# Altium footprint library IC.Pcblib: 91 footprints (part 2 of 6)
Each footprint in its own frame and in the unit in brackets; x right, y up, seen from the top. Pads: shape width x height; smd on the part's side, far side on the other; paste and mask are expansions set on the pad; w line width, h text height; cw(c..) or ccw(c..) is an arc to the next point about the centre after c.
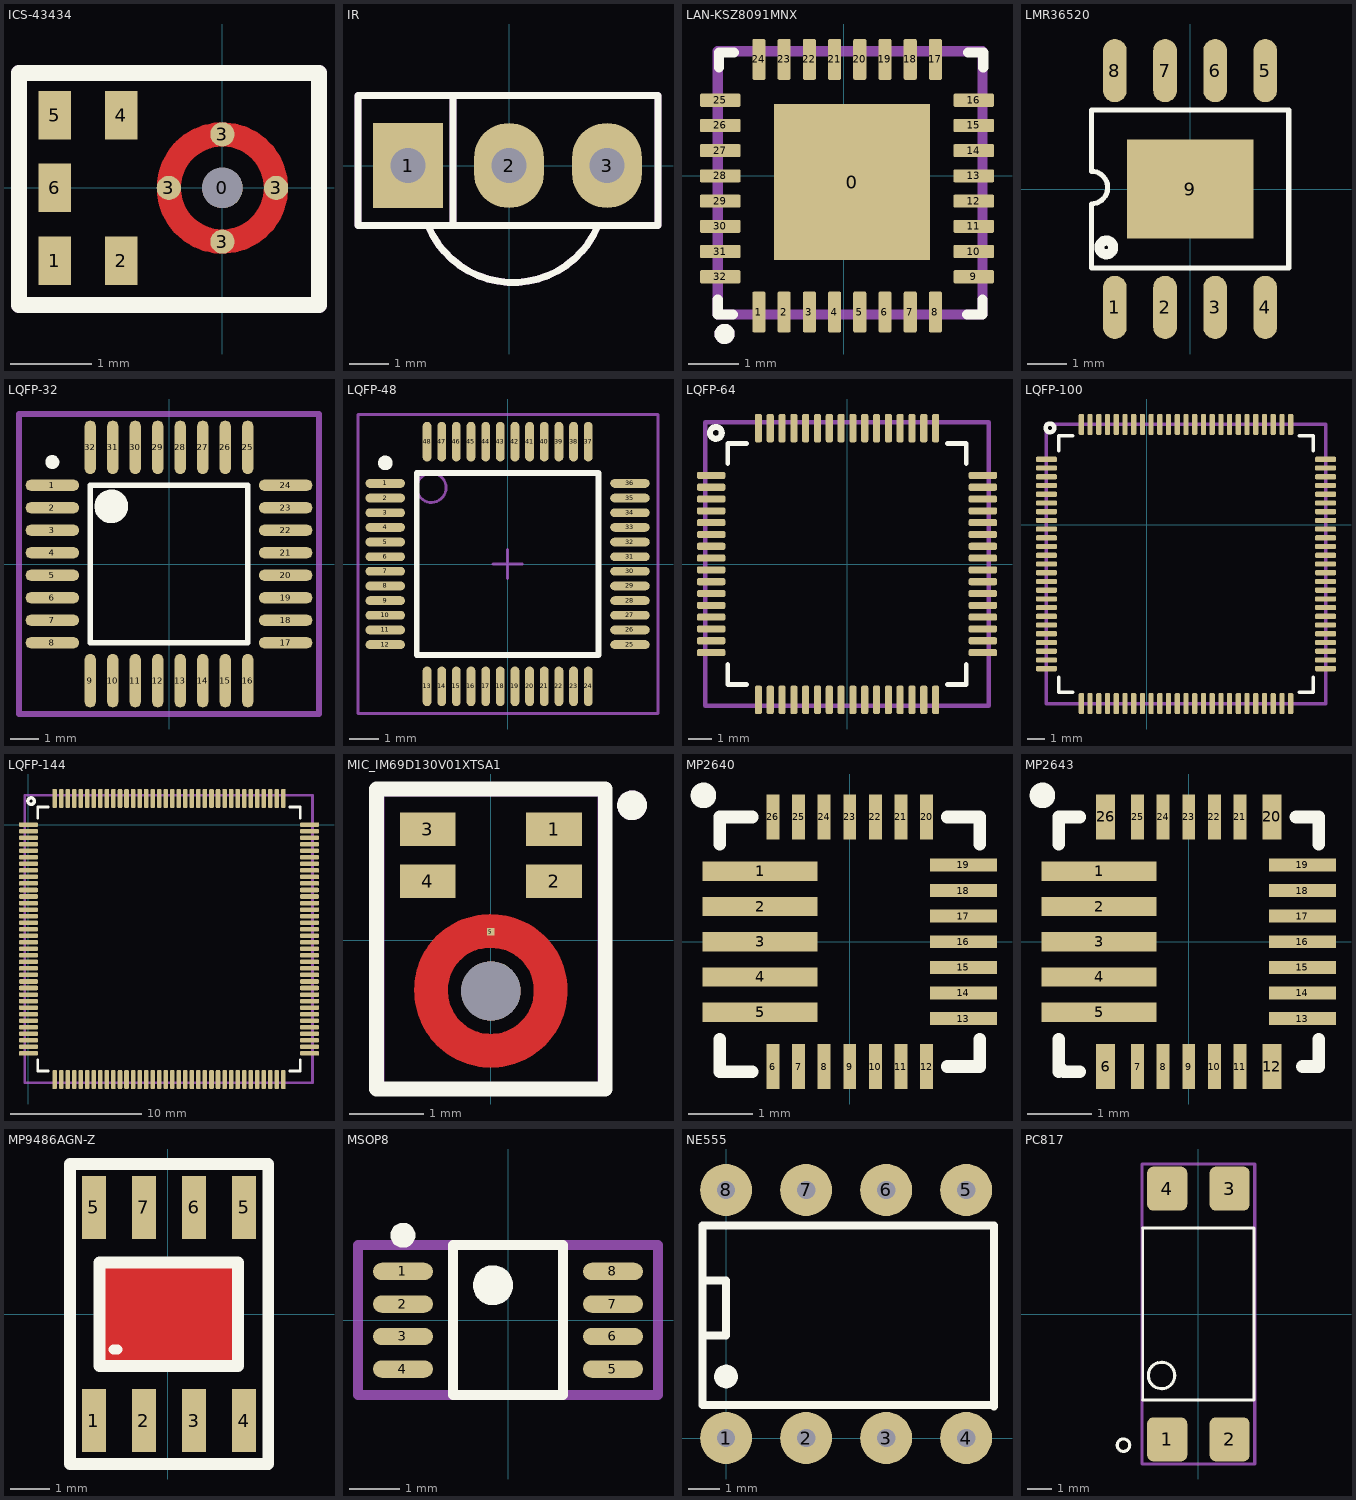
[diagram p1: the footprints below, top view; thin cyan lines are the x and y axes]

## ICS-43434 [mm] "INVENSENSE MEMS DIGITAL MICROPHONE"
pads (10):
  round 0.5 hole 0.5 unplated paste-5 mask+0.775: 0(0,0)
  rect 0.4x0.6 smd: 1(-2.074,-0.9) 2(-1.252,-0.9) 4(-1.252,0.9) 5(-2.074,0.9) 6(-2.074,0)
  round 0.3 smd: 3(-0.663,0) 3(0,-0.663) 3(0.663,0)
  round 0.3 smd paste+0: 3(0,0.663)
Top Layer:
  circle w0.3: c0,0 r0.663
Top Overlay:
  lines w0.2: -2.515,-1.448 -2.515,1.422 1.194,1.422 1.194,-1.448 -2.515,-1.448
Mechanical 13:
  lines w0.2: -2.515,-1.448 -2.515,1.422 1.194,1.422 1.194,-1.448 -2.515,-1.448
  text ".Designator" at -2.616,-0.562 h2
3D body: height 1, standoff 0, extent -2.45,-1.325 1.04,1.325

## IR [mil]
pads (3):
  rect 70x85 hole 35: 1(-101,0)
  oval 70x85 hole 35: 2(0,0) 3(98,0)
Top Overlay:
  lines w7: -81,-60 ccw(c4,-25) 89,-60 ; -56,-60 -56,70 ; -151,-60 149,-60 149,70 -151,70 -151,-60
Mechanical 13:
  lines w7: -81,-60 ccw(c4,-25) 89,-60 ; -56,-60 -56,70 ; -151,-60 -151,70 149,70 149,-60 -151,-60
Mechanical 15:
  lines w7: -81,-60 ccw(c4,-25) 89,-60 ; -56,-60 -56,70 ; -151,-60 -151,70 149,70 149,-60 -151,-60
3D body "SW3dPS-TO92.STEP": height 245.04, standoff -199.79, extent -108.87,-99.53 108.87,61.03

## LAN-KSZ8091MNX [mm]
pads (33):
  rect 3.1x3.1 smd paste-2539.97 mask+0.102: 0(0.163,-0.126)
  rrect25% 0.26x0.81 smd: 1(-1.683,-2.704) 2(-1.183,-2.704) 3(-0.683,-2.704) 4(-0.183,-2.704) 5(0.317,-2.704) 6(0.817,-2.704) 7(1.317,-2.704) 8(1.817,-2.704) 17(1.817,2.306) 18(1.317,2.306) 19(0.817,2.306) 20(0.317,2.306) 21(-0.183,2.306) 22(-0.683,2.306) 23(-1.183,2.306) 24(-1.683,2.306)
  rrect25% 0.81x0.26 smd: 9(2.577,-2.004) 10(2.577,-1.504) 11(2.577,-1.004) 12(2.577,-0.504) 13(2.577,-0.004) 14(2.577,0.496) 15(2.577,0.996) 16(2.577,1.496) 25(-2.45,1.496) 26(-2.45,0.996) 27(-2.45,0.496) 28(-2.45,-0.004) 29(-2.45,-0.504) 30(-2.45,-1.004) 31(-2.45,-1.504) 32(-2.45,-2.004)
Top Overlay:
  circle w0.2: c-2.365,-3.139 r0.1
  lines w0.2: -2.5,-2.454 -2.5,-2.754 -2.2,-2.754 ; -2.475,2.146 -2.475,2.446 -2.175,2.446 ; 2.447,-2.754 2.747,-2.754 2.747,-2.454 ; 2.465,2.446 2.765,2.446 2.765,2.146
Top Paste:
  region: -1.02,1.016 -1.02,0 -0.004,0 -0.004,1.016
  region: 1.266,1.016 0.25,1.016 0.25,0 1.266,0
  region: 1.266,-1.27 1.266,-0.254 0.25,-0.254 0.25,-1.27
  region: -1.02,-1.27 -0.004,-1.27 -0.004,-0.254 -1.02,-0.254
Mechanical 13:
  circle w0.2: c-2.365,-3.139 r0.1
  lines w0.2: -2.5,-2.754 -2.5,2.468 2.747,2.468 2.747,-2.754 -2.5,-2.754
  text ".Designator" at -0.2,-3.129 h1
Mechanical 15:
  text ".Comment" at -0.488,-2.742 h1
3D body "QFN-24 (4x4x0.9).step": height 0.92, standoff 0, extent -1.825,-2.114 2.175,1.886

## LMR36520 [mm]
pads (9):
  oval 0.6x1.6 smd paste+0 mask+0.051: 1(-1.905,-3) 2(-0.635,-3) 3(0.635,-3) 4(1.905,-3) 5(1.905,3) 6(0.635,3) 7(-0.635,3) 8(-1.905,3)
  rect 3.2x2.5 smd paste+0 mask+0.051: 9(0,0)
Top Overlay:
  circle w0.254: c-2.123,-1.479 r0.175
  lines w0.129: -2.5,0.45 cw(c-2.5,0.037) -2.499,-0.376 ; -2.5,-0.375 -2.5,-2 2.5,-2 2.5,2 -2.5,2 -2.5,0.45
Mechanical 15:
  circle w0.2: c-1.898,-3.235 r0.1
3D body "SOIC-81.step": height 1.44, standoff 0, extent -2.5,-3.015 2.5,3.015

## LQFP-32 [mm]
pads (32):
  oval 1.9x0.4 smd: 1(-4.15,2.8) 2(-4.15,2) 3(-4.15,1.2) 4(-4.15,0.4) 5(-4.15,-0.4) 6(-4.15,-1.2) 7(-4.15,-2) 8(-4.15,-2.8) 17(4.15,-2.8) 18(4.15,-2) 19(4.15,-1.2) 20(4.15,-0.4) 21(4.15,0.4) 22(4.15,1.2) 23(4.15,2) 24(4.15,2.8)
  oval 0.4x1.9 smd: 9(-2.8,-4.15) 10(-2,-4.15) 11(-1.2,-4.15) 12(-0.4,-4.15) 13(0.4,-4.15) 14(1.2,-4.15) 15(2,-4.15) 16(2.8,-4.15) 25(2.8,4.15) 26(2,4.15) 27(1.2,4.15) 28(0.4,4.15) 29(-0.4,4.15) 30(-1.2,4.15) 31(-2,4.15) 32(-2.8,4.15)
Top Overlay:
  circle w0.6: c-2.05,2.05 r0.3
  circle w0.25: c-4.15,3.625 r0.125
  lines w0.2: -2.8,-2.8 2.8,-2.8 2.8,2.8 -2.8,2.8 -2.8,-2.8
Mechanical 13:
  lines w0.2: -5.334,-5.334 5.334,-5.334 5.334,5.334 -5.334,5.334 -5.334,-5.334
  text ".Designator" at -2.1,-0.2 h1
Mechanical 15:
  lines w0.2: -5.334,-5.334 5.334,-5.334 5.334,5.334 -5.334,5.334 -5.334,-5.334
  text ".Comment" at -2.1,-0.2 h1
3D body "User Library-TQFP-32.STEP": height 1.4, standoff -0.06, extent -4.5,-4.5 4.5,4.5

## LQFP-48 [mm] "TSQFP, 48-Leads, Body 7.00x7.00mm, Pitch 0.50mm, IPC Medium Density"
height 1.6
pads (48):
  oval 1.35x0.3 smd: 1(-4.175,2.75) 2(-4.175,2.25) 3(-4.175,1.75) 4(-4.175,1.25) 5(-4.175,0.75) 6(-4.175,0.25) 7(-4.175,-0.25) 8(-4.175,-0.75) 9(-4.175,-1.25) 10(-4.175,-1.75) 11(-4.175,-2.25) 12(-4.175,-2.75) 25(4.175,-2.75) 26(4.175,-2.25) 27(4.175,-1.75) 28(4.175,-1.25) 29(4.175,-0.75) 30(4.175,-0.25) 31(4.175,0.25) 32(4.175,0.75) 33(4.175,1.25) 34(4.175,1.75) 35(4.175,2.25) 36(4.175,2.75)
  oval 0.3x1.35 smd: 13(-2.75,-4.175) 14(-2.25,-4.175) 15(-1.75,-4.175) 16(-1.25,-4.175) 17(-0.75,-4.175) 18(-0.25,-4.175) 19(0.25,-4.175) 20(0.75,-4.175) 21(1.25,-4.175) 22(1.75,-4.175) 23(2.25,-4.175) 24(2.75,-4.175) 37(2.75,4.175) 38(2.25,4.175) 39(1.75,4.175) 40(1.25,4.175) 41(0.75,4.175) 42(0.25,4.175) 43(-0.25,4.175) 44(-0.75,4.175) 45(-1.25,4.175) 46(-1.75,4.175) 47(-2.25,4.175) 48(-2.75,4.175)
Top Overlay:
  circle w0.25: c-4.175,3.45 r0.125
  lines w0.2: -3.1,-3.1 3.1,-3.1 3.1,3.1 -3.1,3.1 -3.1,-3.1
Mechanical 13:
  circle w0.1: c-2.6,2.6 r0.5
  lines w0.1: -5.105,-5.105 5.131,-5.105 5.131,5.105 -5.105,5.105 -5.105,-5.105
  text ".Designator" at -2.032,-0.254 h1
Mechanical 15:
  lines w0.05: -5.1,-5.1 5.1,-5.1 5.1,5.1 -5.1,5.1 -5.1,-5.1
  lines w0.1: -0.5,0 0.5,0 ; 0,-0.5 0,0.5
  text ".Comment" at -1.905,-0.254 h1
3D body "TSQFP50P890X890X160-48N.step": height 1.6, standoff 0, extent -4.45,-4.45 4.45,4.45

## LQFP-64 [mm]
pads (64):
  rrect50% 1.2x0.3 smd: 1(-5.75,3.75) 2(-5.75,3.25) 3(-5.75,2.75) 4(-5.75,2.25) 5(-5.75,1.75) 6(-5.75,1.25) 7(-5.75,0.75) 8(-5.75,0.25) 9(-5.75,-0.25) 10(-5.75,-0.75) 11(-5.75,-1.25) 12(-5.75,-1.75) 13(-5.75,-2.25) 14(-5.75,-2.75) 15(-5.75,-3.25) 16(-5.75,-3.75) 33(5.75,-3.75) 34(5.75,-3.25) 35(5.75,-2.75) 36(5.75,-2.25) 37(5.75,-1.75) 38(5.75,-1.25) 39(5.75,-0.75) 40(5.75,-0.25) 41(5.75,0.25) 42(5.75,0.75) 43(5.75,1.25) 44(5.75,1.75) 45(5.75,2.25) 46(5.75,2.75) 47(5.75,3.25) 48(5.75,3.75)
  rrect50% 0.3x1.2 smd: 17(-3.75,-5.75) 18(-3.25,-5.75) 19(-2.75,-5.75) 20(-2.25,-5.75) 21(-1.75,-5.75) 22(-1.25,-5.75) 23(-0.75,-5.75) 24(-0.25,-5.75) 25(0.25,-5.75) 26(0.75,-5.75) 27(1.25,-5.75) 28(1.75,-5.75) 29(2.25,-5.75) 30(2.75,-5.75) 31(3.25,-5.75) 32(3.75,-5.75) 49(3.75,5.75) 50(3.25,5.75) 51(2.75,5.75) 52(2.25,5.75) 53(1.75,5.75) 54(1.25,5.75) 55(0.75,5.75) 56(0.25,5.75) 57(-0.25,5.75) 58(-0.75,5.75) 59(-1.25,5.75) 60(-1.75,5.75) 61(-2.25,5.75) 62(-2.75,5.75) 63(-3.25,5.75) 64(-3.75,5.75)
Top Overlay:
  circle w0.254: c-5.55,5.55 r0.25
  lines w0.2: -5.05,-4.25 -5.05,-5.1 -4.25,-5.1 ; -5.05,4.25 -5.05,5.1 -4.25,5.1 ; 4.25,-5.1 5.05,-5.1 5.05,-4.25 ; 4.25,5.1 5.05,5.1 5.05,4.25
Mechanical 13:
  lines w0.2: -6,-6 6,-6 6,6 -6,6 -6,-6
  text ".Designator" at -3.55,-0.15 h1.5
Mechanical 15:
  lines w0.2: -6,-6 6,-6 6,6 -6,6 -6,-6
  text ".Comment" at -3.6,0.15 h1.5
3D body "User Library-LQFP64-1.step": height 1.56, standoff 0, extent -6,-6 6,6

## LQFP-100 [mm]
pads (100):
  rrect50% 1.2x0.3 smd: 1(-5.75,3.75) 2(-5.75,3.25) 3(-5.75,2.75) 4(-5.75,2.25) 5(-5.75,1.75) 6(-5.75,1.25) 7(-5.75,0.75) 8(-5.75,0.25) 9(-5.75,-0.25) 10(-5.75,-0.75) 11(-5.75,-1.25) 12(-5.75,-1.75) 13(-5.75,-2.25) 14(-5.75,-2.75) 15(-5.75,-3.25) 16(-5.75,-3.75) 17(-5.75,-4.25) 18(-5.75,-4.75) 19(-5.75,-5.25) 20(-5.75,-5.75) 21(-5.75,-6.25) 22(-5.75,-6.75) 23(-5.75,-7.25) 24(-5.75,-7.75) 25(-5.75,-8.25) 51(10.25,-8.25) 52(10.25,-7.75) 53(10.25,-7.25) 54(10.25,-6.75) 55(10.25,-6.25) 56(10.25,-5.75) 57(10.25,-5.25) 58(10.25,-4.75) 59(10.25,-4.25) 60(10.25,-3.75) 61(10.25,-3.25) 62(10.25,-2.75) 63(10.25,-2.25) 64(10.25,-1.75) 65(10.25,-1.25) 66(10.25,-0.75) 67(10.25,-0.25) 68(10.25,0.25) 69(10.25,0.75) 70(10.25,1.25) 71(10.25,1.75) 72(10.25,2.25) 73(10.25,2.75) 74(10.25,3.25) 75(10.25,3.75)
  rrect50% 0.3x1.2 smd: 26(-3.75,-10.25) 27(-3.25,-10.25) 28(-2.75,-10.25) 29(-2.25,-10.25) 30(-1.75,-10.25) 31(-1.25,-10.25) 32(-0.75,-10.25) 33(-0.25,-10.25) 34(0.25,-10.25) 35(0.75,-10.25) 36(1.25,-10.25) 37(1.75,-10.25) 38(2.25,-10.25) 39(2.75,-10.25) 40(3.25,-10.25) 41(3.75,-10.25) 42(4.25,-10.25) 43(4.75,-10.25) 44(5.25,-10.25) 45(5.75,-10.25) 46(6.25,-10.25) 47(6.75,-10.25) 48(7.25,-10.25) 49(7.75,-10.25) 50(8.25,-10.25) 76(8.25,5.75) 77(7.75,5.75) 78(7.25,5.75) 79(6.75,5.75) 80(6.25,5.75) 81(5.75,5.75) 82(5.25,5.75) 83(4.75,5.75) 84(4.25,5.75) 85(3.75,5.75) 86(3.25,5.75) 87(2.75,5.75) 88(2.25,5.75) 89(1.75,5.75) 90(1.25,5.75) 91(0.75,5.75) 92(0.25,5.75) 93(-0.25,5.75) 94(-0.75,5.75) 95(-1.25,5.75) 96(-1.75,5.75) 97(-2.25,5.75) 98(-2.75,5.75) 99(-3.25,5.75) 100(-3.75,5.75)
Top Overlay:
  circle w0.254: c-5.55,5.55 r0.25
  lines w0.2: -5.05,-8.75 -5.05,-9.6 -4.25,-9.6 ; -5.05,4.25 -5.05,5.1 -4.25,5.1 ; 8.75,-9.6 9.55,-9.6 9.55,-8.75 ; 8.75,5.1 9.55,5.1 9.55,4.25
Mechanical 13:
  lines w0.2: -5.75,-10.25 10.25,-10.25 10.25,5.75 -5.75,5.75 -5.75,-10.25
  text ".Designator" at -3.55,-0.15 h1.5
Mechanical 15:
  lines w0.2: -5.75,-10.25 10.25,-10.25 10.25,5.75 -5.75,5.75 -5.75,-10.25
  text ".Comment" at -3.6,0.15 h1.5
3D body "User Library-LQFP100_Grid_0_5.STEP": height 1.6, standoff 0, extent -5.75,-10.25 10.25,5.75

## LQFP-144 [mm]
pads (144):
  rrect50% 1.45x0.35 smd: 1(0,0) 2(0,-0.5) 3(0,-1) 4(0,-1.5) 5(0,-2) 6(0,-2.5) 7(0,-3) 8(0,-3.5) 9(0,-4) 10(0,-4.5) 11(0,-5) 12(0,-5.5) 13(0,-6) 14(0,-6.5) 15(0,-7) 16(0,-7.5) 17(0,-8) 18(0,-8.5) 19(0,-9) 20(0,-9.5) 21(0,-10) 22(0,-10.5) 23(0,-11) 24(0,-11.5) 25(0,-12) 26(0,-12.5) 27(0,-13) 28(0,-13.5) 29(0,-14) 30(0,-14.5) 31(0,-15) 32(0,-15.5) 33(0,-16) 34(0,-16.5) 35(0,-17) 36(0,-17.5) 73(21.5,-17.5) 74(21.5,-17) 75(21.5,-16.5) 76(21.5,-16) 77(21.5,-15.5) 78(21.5,-15) 79(21.5,-14.5) 80(21.5,-14) 81(21.5,-13.5) 82(21.5,-13) 83(21.5,-12.5) 84(21.5,-12) 85(21.5,-11.5) 86(21.5,-11) 87(21.5,-10.5) 88(21.5,-10) 89(21.5,-9.5) 90(21.5,-9) 91(21.5,-8.5) 92(21.5,-8) 93(21.5,-7.5) 94(21.5,-7) 95(21.5,-6.5) 96(21.5,-6) 97(21.5,-5.5) 98(21.5,-5) 99(21.5,-4.5) 100(21.5,-4) 101(21.5,-3.5) 102(21.5,-3) 103(21.5,-2.5) 104(21.5,-2) 105(21.5,-1.5) 106(21.5,-1) 107(21.5,-0.5) 108(21.5,0)
  rrect50% 0.35x1.45 smd: 37(2,-19.5) 38(2.5,-19.5) 39(3,-19.5) 40(3.5,-19.5) 41(4,-19.5) 42(4.5,-19.5) 43(5,-19.5) 44(5.5,-19.5) 45(6,-19.5) 46(6.5,-19.5) 47(7,-19.5) 48(7.5,-19.5) 49(8,-19.5) 50(8.5,-19.5) 51(9,-19.5) 52(9.5,-19.5) 53(10,-19.5) 54(10.5,-19.5) 55(11,-19.5) 56(11.5,-19.5) 57(12,-19.5) 58(12.5,-19.5) 59(13,-19.5) 60(13.5,-19.5) 61(14,-19.5) 62(14.5,-19.5) 63(15,-19.5) 64(15.5,-19.5) 65(16,-19.5) 66(16.5,-19.5) 67(17,-19.5) 68(17.5,-19.5) 69(18,-19.5) 70(18.5,-19.5) 71(19,-19.5) 72(19.5,-19.5) 109(19.5,2) 110(19,2) 111(18.5,2) 112(18,2) 113(17.5,2) 114(17,2) 115(16.5,2) 116(16,2) 117(15.5,2) 118(15,2) 119(14.5,2) 120(14,2) 121(13.5,2) 122(13,2) 123(12.5,2) 124(12,2) 125(11.5,2) 126(11,2) 127(10.5,2) 128(10,2) 129(9.5,2) 130(9,2) 131(8.5,2) 132(8,2) 133(7.5,2) 134(7,2) 135(6.5,2) 136(6,2) 137(5.5,2) 138(5,2) 139(4.5,2) 140(4,2) 141(3.5,2) 142(3,2) 143(2.5,2) 144(2,2)
Top Overlay:
  circle w0.254: c0.2,1.8 r0.25
  lines w0.2: 0.7,-18 0.7,-18.85 1.5,-18.85 ; 0.7,0.5 0.7,1.35 1.5,1.35 ; 20,-18.85 20.8,-18.85 20.8,-18 ; 20,1.35 20.8,1.35 20.8,0.5
Mechanical 13:
  lines w0.2: -0.275,-19.75 21.725,-19.75 21.725,2.25 -0.275,2.25 -0.275,-19.75
  text ".Designator" at 2.2,-3.9 h1.5
Mechanical 15:
  lines w0.2: -0.275,-19.75 21.725,-19.75 21.725,2.25 -0.275,2.25 -0.275,-19.75
  text ".Comment" at 2.15,-3.6 h1.5
3D body "User Library-LQFP144-1.STEP": height 1.6, standoff 0, extent -0.275,-19.75 21.725,2.25

## MIC_IM69D130V01XTSA1 [mm]
pads (6):
  rect 0.75x0.45 smd paste-1: 1(0.85,1.5) 2(0.85,0.8) 3(-0.85,1.5) 4(-0.85,0.8)
  rect 0.1x0.1 smd paste-1 mask+0: 5(0,0.12)
  round 0.8 hole 0.8 unplated: ""(0,-0.68)
Top Layer:
  region: 247 vertices and 0 holes, not listed, extent -1.03,-1.71 1.03,0.35
Top Overlay:
  circle w0.2: c1.9,1.82 r0.1
  lines w0.2: -1.54,-2 -1.54,2.04 1.54,2.04 1.54,-2 -1.54,-2
Top Paste:
  drawing of 10 lines, arcs and shapes, not listed
Top Solder:
  circle w0.45: c0,-0.68 r0.805
Mechanical 13:
  circle w0.2: c1.9,1.82 r0.1
  lines w0.127: -1.5,-2 1.5,-2 1.5,2 -1.5,2 -1.5,-2
  text ".Designator" at -1.016,-0.635 h1.5

## MP2640 [mm]
pads (26):
  rect 1.8x0.3 smd: 1(-1.4,1.1) 2(-1.4,0.55) 3(-1.4,0) 4(-1.4,-0.55) 5(-1.4,-1.1)
  rect 0.2x0.7 smd: 6(-1.2,-1.95) 7(-0.8,-1.95) 8(-0.4,-1.95) 9(0,-1.95) 10(0.4,-1.95) 11(0.8,-1.95) 12(1.2,-1.95) 20(1.2,1.95) 21(0.8,1.95) 22(0.4,1.95) 23(0,1.95) 24(-0.4,1.95) 25(-0.8,1.95) 26(-1.2,1.95)
  rect 1.05x0.2 smd: 13(1.775,-1.2) 14(1.775,-0.8) 15(1.775,-0.4) 16(1.775,0) 17(1.775,0.4) 18(1.775,0.8) 19(1.775,1.2)
Top Overlay:
  circle w0.2: c-2.286,2.286 r0.1
  lines w0.2: -2.032,-1.524 -2.032,-2.032 -1.524,-2.032 ; -2.032,1.524 -2.032,1.95 -1.524,1.95 ; 1.524,-1.95 2.032,-1.95 2.032,-1.524 ; 1.524,1.95 2.032,1.95 2.032,1.524
3D body: height 1, standoff 0, extent -2.032,-1.95 2.032,1.95

## MP2643 [mm]
pads (26):
  rect 1.8x0.3 smd: 1(-1.4,1.1) 2(-1.4,0.55) 3(-1.4,0) 4(-1.4,-0.55) 5(-1.4,-1.1)
  rect 0.3x0.7 smd: 6(-1.3,-1.95) 12(1.3,-1.95) 20(1.3,1.95) 26(-1.3,1.95)
  rect 0.2x0.7 smd: 7(-0.8,-1.95) 8(-0.4,-1.95) 9(0,-1.95) 10(0.4,-1.95) 11(0.8,-1.95) 21(0.8,1.95) 22(0.4,1.95) 23(0,1.95) 24(-0.4,1.95) 25(-0.8,1.95)
  rect 1.05x0.2 smd: 13(1.775,-1.2) 14(1.775,-0.8) 15(1.775,-0.4) 16(1.775,0) 17(1.775,0.4) 18(1.775,0.8) 19(1.775,1.2)
Top Overlay:
  circle w0.2: c-2.286,2.286 r0.1
  lines w0.2: -2.032,-2.032 -2.032,-1.524 ; -2.032,-1.95 -1.95,-2.032 -1.702,-2.032 ; -2.032,1.524 -2.032,1.95 -1.702,1.95 ; 1.676,1.95 2.032,1.95 2.032,1.524 ; 1.775,-1.95 2.032,-1.95 2.032,-1.524
3D body: height 1, standoff 0, extent -2.032,-1.95 2.032,1.95

## MP9486AGN-Z [mm]
height 1.7
pads (8):
  rect 0.61x1.6 smd: 1(-1.87,-2.7) 2(-0.6,-2.7) 3(0.67,-2.7) 4(1.94,-2.7) 5(-1.87,2.7) 5(1.94,2.7) 6(0.67,2.7) 7(-0.6,2.7)
Top Layer:
  region: -1.7,1.25 1.73,1.25 1.76,1.22 1.76,-1.25 -1.64,-1.25 -1.74,-1.35
Top Overlay:
  lines w0.254: -1.366,-0.896 -1.266,-0.896
  lines w0.3: -1.725,-1.316 1.785,-1.316 1.785,1.304 -1.725,1.304 -1.725,-1.241 ; -2.47,-3.8 -2.47,3.8 2.55,3.8 2.55,-3.8 -2.47,-3.8

## MSOP8 [mm] "MSOP, 8-Leads, Body 3.00x3.00mm, Pitch 0.65mm, IPC High Density"
height 1
pads (8):
  oval 1.2x0.35 smd: 1(-2.1,0.975) 2(-2.1,0.325) 3(-2.1,-0.325) 4(-2.1,-0.975) 5(2.1,-0.975) 6(2.1,-0.325) 7(2.1,0.325) 8(2.1,0.975)
Top Overlay:
  circle w0.25: c-2.1,1.7 r0.125
  circle w0.4: c-0.3,0.7 r0.2
  lines w0.2: -1.1,-1.5 -1.1,1.5 1.1,1.5 1.1,-1.5 -1.1,-1.5
Mechanical 13:
  lines w0.2: -3,1.45 -3,-1.5 3,-1.5 3,1.5 -3,1.5
  text ".Designator" at -2.5,0 h1
Mechanical 15:
  lines w0.2: -3,1.45 -3,-1.5 3,-1.5 3,1.5 -3,1.5
  text ".Comment" at -2.5,0 h1
3D body "29213.stp": height 0.94, standoff -0.04, extent -2,-1.45 2,1.45

## NE555 [mm]
pads (9):
  round 1.65 hole 0.58 mask+0.102: 1(0,0) 2(2.54,0) 3(5.08,0) 4(7.62,0) 5(7.62,7.87) 6(5.08,7.87) 7(2.54,7.87) 8(0,7.87)
  round 0.762 on Top Overlay mask+0.102: ""(0,1.95)
Top Overlay:
  lines w0.254: -0.75,3.25 0,3.25 0,5 -0.7,5 ; -0.75,1.05 -0.75,6.75 8.5,6.75 8.5,1 8.45,1.05 -0.75,1.05
3D body: height 0.25, standoff 0, extent -1.275,0.2 8.875,7.9

## PC817 [mm] "Small Outline IC (SOIC), 2.54 mm pitch; 4 pin, 4.58 mm L X 6.50 mm W X 3.76 mm H body"
height 3.76
pads (4):
  rrect31% 1.63x1.79 smd: 1(-1.27,-5.1) 2(1.27,-5.1) 3(1.27,5.1) 4(-1.27,5.1)
Top Overlay:
  circle w0.127: c-1.5,-2.5 r0.539
  circle w0.127: c-3.048,-5.334 r0.254
  lines w0.12: -2.265,-3.5 -2.265,3.5 ; 2.265,-3.5 2.265,3.5
  lines w0.127: -2.265,-3.5 2.265,-3.5 ; -2.265,3.5 2.265,3.5
Mechanical 13:
  lines w0.12: -2.3,-6.1 2.29,-6.1 2.29,6.1 -2.3,6.1 -2.3,-6.1
  text ".Designator" at 0.6,-3.2 h1.5
Mechanical 15:
  lines w0.127: -2.3,-6.1 -2.3,6.1 2.29,6.1 2.29,-6.1 -2.3,-6.1
  text ".Comment" at 0.3,-3.2 h1.5
3D body "User Library-PC817_Gullwing.STEP": height 3.75, standoff -0.1, extent -2.29,-5 2.29,5